# Altium footprint library Wurth_Elektronik_Electromechanic_Wire_to_Board_Connectors_rev16a.PCBLIB: 662 footprints (part 39 of 42)
Each footprint in its own frame and in the unit in brackets; x right, y up, seen from the top. Pads: shape width x height; smd on the part's side, far side on the other; paste and mask are expansions set on the pad; w line width, h text height; cw(c..) or ccw(c..) is an arc to the next point about the centre after c.
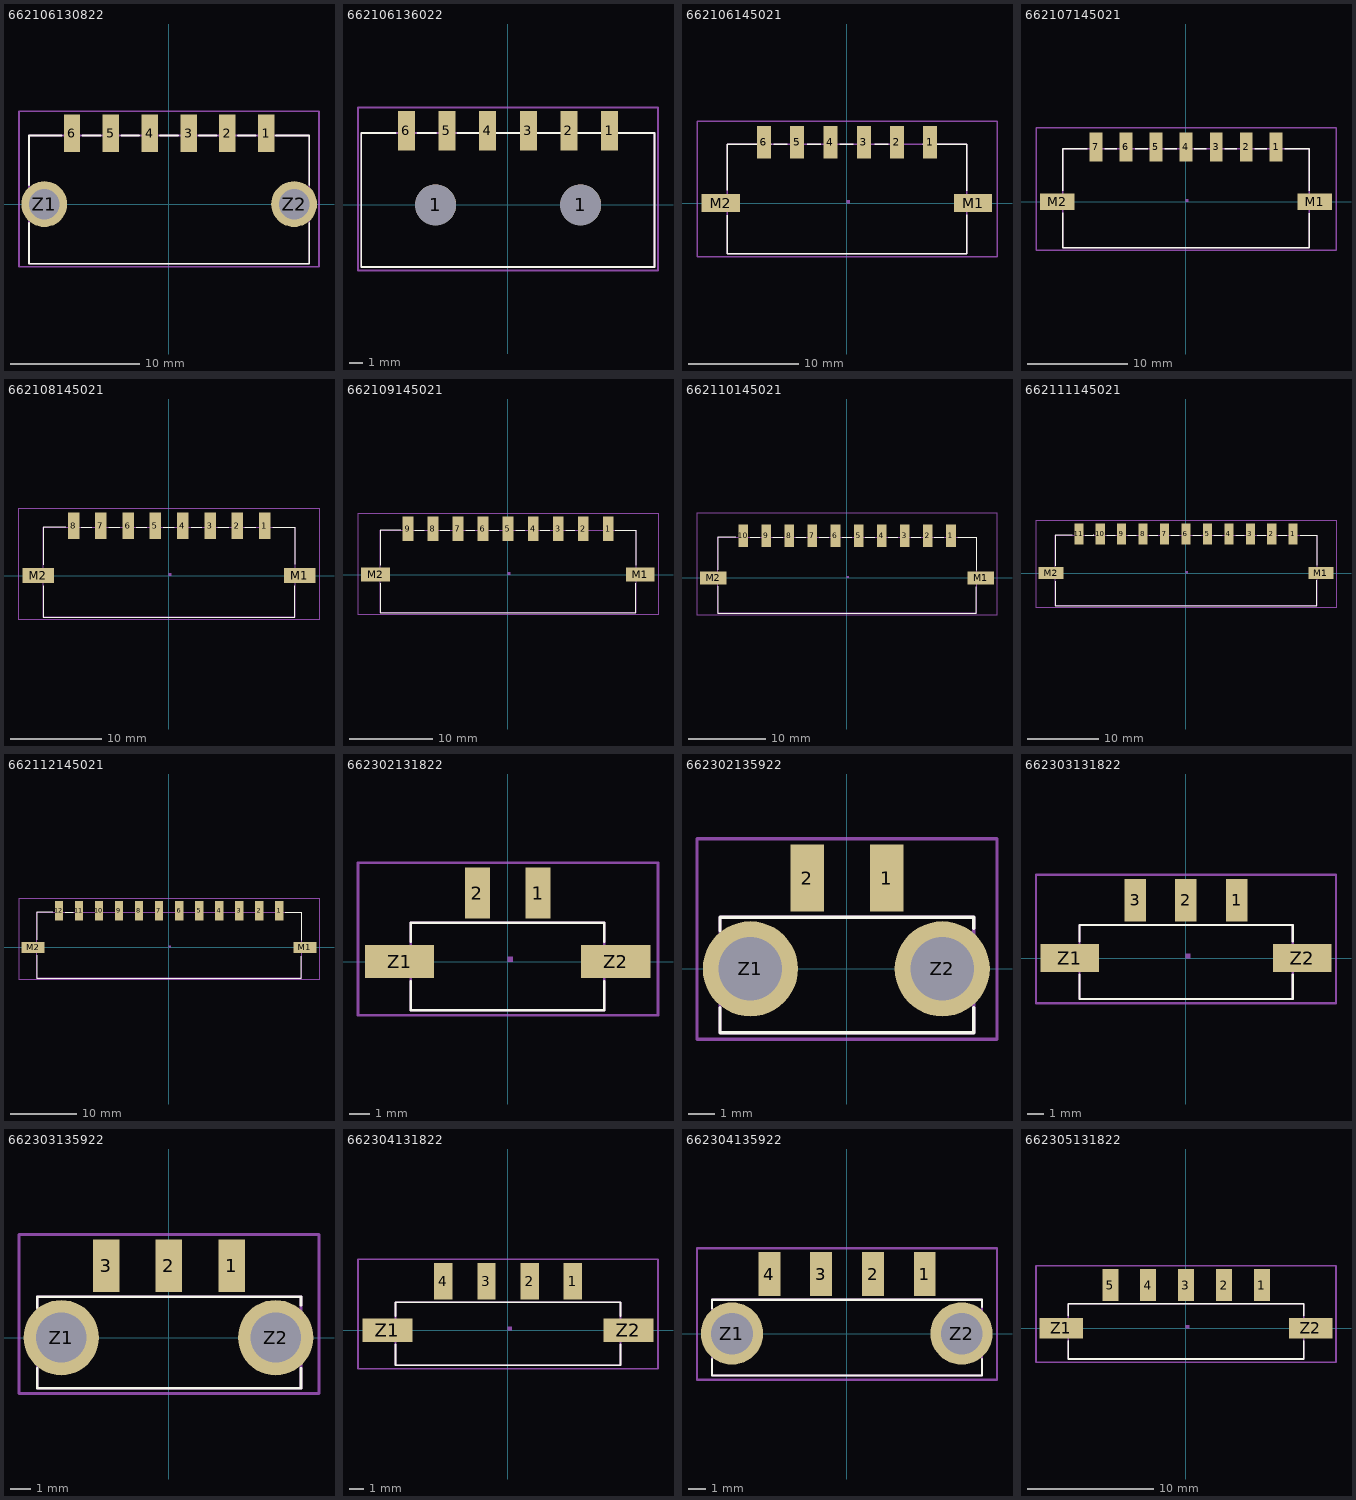
[diagram p38: the footprints below, top view; thin cyan lines are the x and y axes]

## 662106130822 [mil]
pads (8):
  rect 50x115 smd: 1(296,216) 2(178,216) 3(60,216) 4(-59.06,216) 5(-177.17,216) 6(-295.28,216)
  round 139.5 hole 93: Z1(-379.53,0) Z2(381,0)
Top Overlay:
  lines w5: -426.38,-179.53 -426.18,-179.53 ; -426.18,-56.3 -426.18,-181.1 427,-181.1 427,-56.3 ; -426.18,58 -426.18,209 -325.98,209 ; -263.78,209 -208.66,209 ; -145.67,209 -90.55,209 ; -27.56,209 28,209 ; 91,209 146,209 ; 209,209 264,209 ; 326,209 427,209 427,58
Mechanical 2:
  text ">Name" at -168.11,316 h77.5
Mechanical 4:
  text ">Value" at -185.43,-250.39 h77.5
Mechanical 16:
  lines w5: -426.18,-181.1 427,-181.1 427,209 -426.18,209 -426.18,-179.53
Mechanical 27:
  lines w5: -456.69,-190.94 457,-190.94 457,283 -456.69,283 -456.69,-190.94

## 662106136022 [mil]
pads (8):
  round 119 hole 119: 1(-210.24,0) 1(212,0)
  rect 50x115 smd: 1(296,216) 2(178,216) 3(60,216) 4(-59.06,216) 5(-177.17,216) 6(-295.28,216)
Top Overlay:
  lines w5: -426.38,-179.53 -426.18,-179.53 ; -325.98,209 -426.18,209 -426.18,-181.1 427,-181.1 427,209 -146.46,209 ; -263.78,209 -208.66,209
Mechanical 2:
  text ">Name" at -199.21,320 h77.5
Mechanical 4:
  text ">Value" at -112.6,-250.39 h77.5
Mechanical 16:
  lines w5: -426.18,-181.1 427,-181.1 427,209 -426.18,209 -426.18,-179.53
Mechanical 27:
  lines w5: -436.02,-190.94 437,-190.94 437,283 -436.02,283 -436.02,-190.94

## 662106145021 [mil]
pads (8):
  rect 50x115 smd: 1(296,216) 2(178,216) 3(60,216) 4(-59.06,216) 5(-177.17,216) 6(-295.28,216)
  rect 136x65 smd: M1(449,0) M2(-448.62,0)
Top Overlay:
  lines w5: -426.18,-43.7 -426.18,-181.1 427,-181.1 427,-41.34 ; -426.18,45 -426.18,209 -270.08,209 ; -260.63,209 -212.2,209 ; -140.94,209 -92.52,209 ; -25.59,209 23,209 ; 99,209 147,209 ; 269,209 427,209 427,43
Mechanical 2:
  text ">NAME" at 587,66 h77.5
Mechanical 4:
  text ">VALUE" at 587,-9.65 h77.5
Mechanical 10:
  region: 0,0 10,0 10,10 0,10
  region: 0,0 10,0 10,10 0,10
  region: 0,0 10,0 10,10 0,10
  region: 0,0 10,0 10,10 0,10
  region: 0,0 10,0 10,10 0,10
  region: 0,0 10,0 10,10 0,10
Mechanical 16:
  lines w5: -426.18,-181.1 427,-181.1 427,209 -426.18,209 -426.18,-181.1
  text "1" at 287,166 h77.5
  text "6" at -313.78,166 h77.5
Mechanical 27:
  lines w5: -533.46,-190.94 534,-190.94 534,291 -533.46,291 -533.46,-190.94

## 662107145021 [mil]
pads (9):
  rect 50x115 smd: 1(355,216) 2(237,216) 3(119,216) 4(0,216) 5(-118.11,216) 6(-236.22,216) 7(-354.33,216)
  rect 136x65 smd: M1(507,0) M2(-507.68,0)
Top Overlay:
  lines w5: -485.04,-42.91 -485.24,-181.1 486,-181.1 486,-46.46 ; -485.04,44 -485.04,209 -388.19,209 ; -320.08,209 -272.05,209 ; -200.39,209 -150.39,209 ; -84.25,209 -36.22,209 ; 32,209 80,209 ; 152,209 200,209 ; 271,209 319,209 ; 389,209 486,209 486,44 ; -150.39,209 -150.39,209
Mechanical 2:
  text ">NAME" at 646,66 h77.5
Mechanical 4:
  text ">VALUE" at 646,-9.65 h77.5
Mechanical 10:
  region: 0,0 10,0 10,10 0,10
Mechanical 16:
  lines w5: -485.24,-181.1 486,-181.1 486,209 -485.24,209 -485.24,-181.1
  text "1" at 346,166 h77.5
  text "7" at -372.83,166 h77.5
Mechanical 27:
  lines w5: -590.55,-190.94 591,-190.94 591,291 -590.55,291 -590.55,-190.94

## 662108145021 [mil]
pads (10):
  rect 50x115 smd: 1(414,216) 2(296,216) 3(178,216) 4(60,216) 5(-59.06,216) 6(-177.17,216) 7(-295.28,216) 8(-413.39,216)
  rect 136x65 smd: M1(566,0) M2(-566.73,0)
Top Overlay:
  lines w5: -544.09,-44.09 -544.29,-181.1 545,-181.1 545,-44.09 ; -544.09,47 -544.09,209 -447.64,209 ; -380.71,209 -333.86,209 ; -260.24,209 -213.39,209 ; -142.13,209 -95.28,209 ; -24.41,209 23,209 ; 96,209 143,209 ; 211,209 258,209 ; 328,209 375,209 ; 449,209 545,209 545,48
Mechanical 2:
  text ">NAME" at 705,66 h77.5
Mechanical 4:
  text ">VALUE" at 705,-9.65 h77.5
Mechanical 10:
  region: 0,0 10,0 10,10 0,10
Mechanical 16:
  lines w5: -544.29,-181.1 545,-181.1 545,209 -544.29,209 -544.29,-181.1
  text "1" at 405,166 h77.5
  text "8" at -431.89,166 h77.5
Mechanical 27:
  lines w5: -649.61,-190.94 650,-190.94 650,291 -649.61,291 -649.61,-190.94

## 662109145021 [mil]
pads (11):
  rect 50x115 smd: 1(473,216) 2(355,216) 3(237,216) 4(119,216) 5(0,216) 6(-118.11,216) 7(-236.22,216) 8(-354.33,216) 9(-472.44,216)
  rect 136x65 smd: M1(625,0) M2(-625.79,0)
Top Overlay:
  lines w5: -603.35,-41.34 -603.35,-181.1 604,-181.1 604,-40.55 ; -603.15,43 -603.15,209 -506.69,209 ; -439.37,209 -395.67,209 ; -319.69,209 -275.98,209 ; -200,209 -156.3,209 ; -86.22,209 -42.52,209 ; 36,209 80,209 ; 153,209 197,209 ; 273,209 316,209 ; 508,209 604,209 604,44
Mechanical 2:
  text ">NAME" at 764,66 h77.5
Mechanical 4:
  text ">VALUE" at 764,-9.65 h77.5
Mechanical 10:
  region: 0,0 10,0 10,10 0,10
Mechanical 16:
  lines w5: -603.35,-181.1 604,-181.1 604,209 -603.35,209 -603.35,-181.1
  text "1" at 464,166 h77.5
  text "9" at -490.94,166 h77.5
Mechanical 27:
  lines w5: -708.66,-190.94 709,-190.94 709,291 -708.66,291 -708.66,-190.94

## 662110145021 [mil]
pads (12):
  rect 50x115 smd: 1(532,216) 2(414,216) 3(296,216) 4(178,216) 5(60,216) 6(-59.06,216) 7(-177.17,216) 8(-295.28,216) 9(-413.39,216) 10(-531.5,216)
  rect 136x65 smd: M1(685,0) M2(-684.84,0)
Top Overlay:
  lines w5: -662.6,41 -662.4,209 -568.9,209 ; -661.42,-43.31 -662.2,-43.31 -662.2,-181.1 663,-181.1 663,-43.7 ; -495.28,209 -446.06,209 ; -379.13,209 -329.92,209 ; -261.02,209 -211.81,209 ; -142.91,209 -93.7,209 ; -24.41,209 25,209 ; 94,209 143,209 ; 212,209 261,209 ; 328,209 377,209 ; 446,209 495,209 ; 567,209 663,209 663,39
Mechanical 2:
  text ">NAME" at 823,66 h77.5
Mechanical 4:
  text ">VALUE" at 823,-9.65 h77.5
Mechanical 10:
  region: 0,0 10,0 10,10 0,10
Mechanical 16:
  lines w5: -662.4,-181.1 663,-181.1 663,209 -662.4,209 -662.4,-181.1
  text "1" at 523,166 h77.5
  text "10" at -581.89,166 h77.5
Mechanical 27:
  lines w5: -767.72,-190.94 768,-190.94 768,334 -767.72,334 -767.72,-190.94

## 662111145021 [mil]
pads (13):
  rect 50x115 smd: 1(591,216) 2(473,216) 3(355,216) 4(237,216) 5(119,216) 6(0,216) 7(-118.11,216) 8(-236.22,216) 9(-354.33,216) 10(-472.44,216) 11(-590.55,216)
  rect 136x65 smd: M1(744,0) M2(-743.9,0)
Top Overlay:
  lines w5: -721.65,-44.49 -721.46,-181.1 722,-181.1 722,-39.76 ; -721.46,41 -721.46,209 -626.38,209 ; -553.94,209 -507.09,209 -507.09,210 ; -436.61,209 -389.76,209 ; -320.47,209 -273.62,209 ; -201.18,209 -154.33,209 ; -84.65,209 -37.8,209 ; 37,209 84,209 ; 154,209 200,209 ; 273,209 320,209 ; 392,209 439,209 ; 508,209 555,209 ; 630,209 722,209 722,42
Mechanical 2:
  text ">NAME" at 882,66 h77.5
Mechanical 4:
  text ">VALUE" at 882,-9.65 h77.5
Mechanical 10:
  region: 0,0 10,0 10,10 0,10
Mechanical 16:
  lines w5: -721.46,-181.1 722,-181.1 722,209 -721.46,209 -721.46,-181.1
  text "1" at 582,166 h77.5
  text "11" at -622.83,166 h77.5
Mechanical 27:
  lines w5: -826.77,-190.94 827,-190.94 827,291 -826.77,291 -826.77,-190.94

## 662112145021 [mil]
pads (14):
  rect 50x115 smd: 1(650,216) 2(532,216) 3(414,216) 4(296,216) 5(178,216) 6(60,216) 7(-59.06,216) 8(-177.17,216) 9(-295.28,216) 10(-413.39,216) 11(-531.5,216) 12(-649.61,216)
  rect 136x65 smd: M1(803,0) M2(-802.95,0)
Top Overlay:
  lines w5: -780.71,-45.67 -780.51,-181.1 781,-181.1 781,-50.39 ; -780.51,45 -780.51,209 -686.61,209 ; -611.81,209 -564.57,209 ; 688,209 781,209 781,44
Mechanical 2:
  text ">NAME" at 941,66 h77.5
Mechanical 4:
  text ">VALUE" at 941,-9.65 h77.5
Mechanical 10:
  region: 0,0 10,0 10,10 0,10
Mechanical 16:
  lines w5: -780.51,-181.1 781,-181.1 781,209 -780.51,209 -780.51,-181.1
  text "1" at 641,166 h77.5
  text "12" at -688.78,166 h77.5
Mechanical 27:
  lines w5: -885.83,-190.94 886,-190.94 886,291 -885.83,291 -885.83,-190.94

## 662302131822 [mil]
pads (4):
  rect 50x100 smd: 1(60,135) 2(-59.06,135)
  rect 136x65 smd: Z1(-212.4,0) Z2(213,0)
Top Overlay:
  lines w5: -189.96,-38.58 -189.96,-95.87 190,-95.87 190,-38.58 ; -189.96,39 -189.96,77 190,77 190,39
Mechanical 2:
  text ">Name" at -114.17,222 h77.5
Mechanical 4:
  text ">Value" at -129.92,-168.5 h77.5
Mechanical 10:
  region: 0,0 10,0 10,10 0,10
Mechanical 16:
  lines w5: -189.96,-95.87 -189.96,77 190,77 190,-95.87 -189.96,-95.87
Mechanical 27:
  lines w5: -294.09,-105.71 296,-105.71 296,195 -294.09,195 -294.09,-105.71

## 662302135922 [mil]
pads (4):
  rect 50x100 smd: 1(60,136) 2(-59.06,136)
  round 142.5 hole 95: Z1(-144.49,0) Z2(143,0)
Top Overlay:
  lines w5: -189.96,-57.87 -189.96,-95.87 190,-95.87 190,-57.87 ; -189.96,57 -189.96,77 190,77 190,61
Mechanical 2:
  text ">Name" at -114.17,222 h77.5
Mechanical 4:
  text ">Value" at -129.92,-179.92 h77.5
Mechanical 16:
  lines w5: -189.96,-95.87 -189.96,77 190,77 190,-95.87 -189.96,-95.87
Mechanical 27:
  lines w5: -224.41,-105.71 225,-105.71 225,195 -224.41,195 -224.41,-105.71

## 662303131822 [mil]
pads (5):
  rect 50x100 smd: 1(119,135) 2(0,135) 3(-118.11,135)
  rect 136x65 smd: Z1(-271.46,0) Z2(272,0)
Top Overlay:
  lines w5: -249.02,-38.58 -249.02,-95.87 250,-95.87 250,-38.58 ; -249.02,39 -249.02,77 250,77 250,39
Mechanical 2:
  text ">Name" at -173.23,222 h77.5
Mechanical 4:
  text ">Value" at -188.98,-172.44 h77.5
Mechanical 10:
  region: 0,0 10,0 10,10 0,10
Mechanical 16:
  lines w5: -249.02,-95.87 -249.02,77 250,77 250,-95.87 -249.02,-95.87
Mechanical 27:
  lines w5: -350.39,-105.71 351,-105.71 351,195 -350.39,195 -350.39,-105.71

## 662303135922 [mil]
pads (5):
  rect 50x100 smd: 1(119,136) 2(0,136) 3(-118.11,136)
  round 142.5 hole 95: Z1(-203.54,0) Z2(202,0)
Top Overlay:
  lines w5: -249.02,-57.87 -249.02,-95.87 250,-95.87 250,-57.87 ; -249.02,57 -249.02,77 250,77 250,61
Mechanical 2:
  text ">Name" at -173.23,222 h77.5
Mechanical 4:
  text ">Value" at -185.04,-168.11 h77.5
Mechanical 16:
  lines w5: -249.02,-95.87 -249.02,77 250,77 250,-95.87 -249.02,-95.87
Mechanical 27:
  lines w5: -283.46,-105.71 284,-105.71 284,195 -283.46,195 -283.46,-105.71

## 662304131822 [mil]
pads (6):
  rect 50x100 smd: 1(178,135) 2(60,135) 3(-59.06,135) 4(-177.17,135)
  rect 136x65 smd: Z1(-330.51,0) Z2(331,0)
Top Overlay:
  lines w5: -308.07,-38.58 -308.07,-95.87 309,-95.87 309,-38.58 ; -308.07,39 -308.07,77 309,77 309,39
Mechanical 2:
  text ">Name" at -97.64,222 h77.5
Mechanical 4:
  text ">Value" at -113.39,-184.25 h77.5
Mechanical 10:
  region: 0,0 10,0 10,10 0,10
Mechanical 16:
  lines w5: -308.07,-95.87 -308.07,77 309,77 309,-95.87 -308.07,-95.87
Mechanical 27:
  lines w5: -411.42,-105.71 412,-105.71 412,195 -411.42,195 -411.42,-105.71

## 662304135922 [mil]
pads (6):
  rect 50x100 smd: 1(178,136) 2(60,136) 3(-59.06,136) 4(-177.17,136)
  round 142.5 hole 95: Z1(-262.6,0) Z2(262,0)
Top Overlay:
  lines w5: -308.07,-57.87 -308.07,-95.87 309,-95.87 309,-57.87 ; -308.07,57 -308.07,77 309,77 309,61
Mechanical 2:
  text ">Name" at -232.28,222 h77.5
Mechanical 4:
  text ">Value" at -248.03,-175.98 h77.5
Mechanical 16:
  lines w5: -308.07,-95.87 -308.07,77 309,77 309,-95.87 -308.07,-95.87
Mechanical 27:
  lines w5: -342.52,-105.71 343,-105.71 343,195 -342.52,195 -342.52,-105.71

## 662305131822 [mil]
pads (7):
  rect 50x100 smd: 1(237,135) 2(119,135) 3(0,135) 4(-118.11,135) 5(-236.22,135)
  rect 136x65 smd: Z1(-389.57,0) Z2(390,0)
Top Overlay:
  lines w5: -367.13,-38.58 -367.13,-95.87 368,-95.87 368,-38.58 ; -367.13,39 -367.13,77 368,77 368,39
Mechanical 2:
  text ">Name" at -55.12,222 h77.5
Mechanical 4:
  text ">Value" at -70.87,-180.31 h77.5
Mechanical 10:
  region: 0,0 10,0 10,10 0,10
Mechanical 16:
  lines w5: -367.13,-95.87 -367.13,77 368,77 368,-95.87 -367.13,-95.87
Mechanical 27:
  lines w5: -468.5,-105.71 469,-105.71 469,195 -468.5,195 -468.5,-105.71